# Altium footprint library ACTION_插件.PcbLib: 118 footprints (part 8 of 8)
Each footprint in its own frame and in the unit in brackets; x right, y up, seen from the top. Pads: shape width x height; smd on the part's side, far side on the other; paste and mask are expansions set on the pad; w line width, h text height; cw(c..) or ccw(c..) is an arc to the next point about the centre after c.
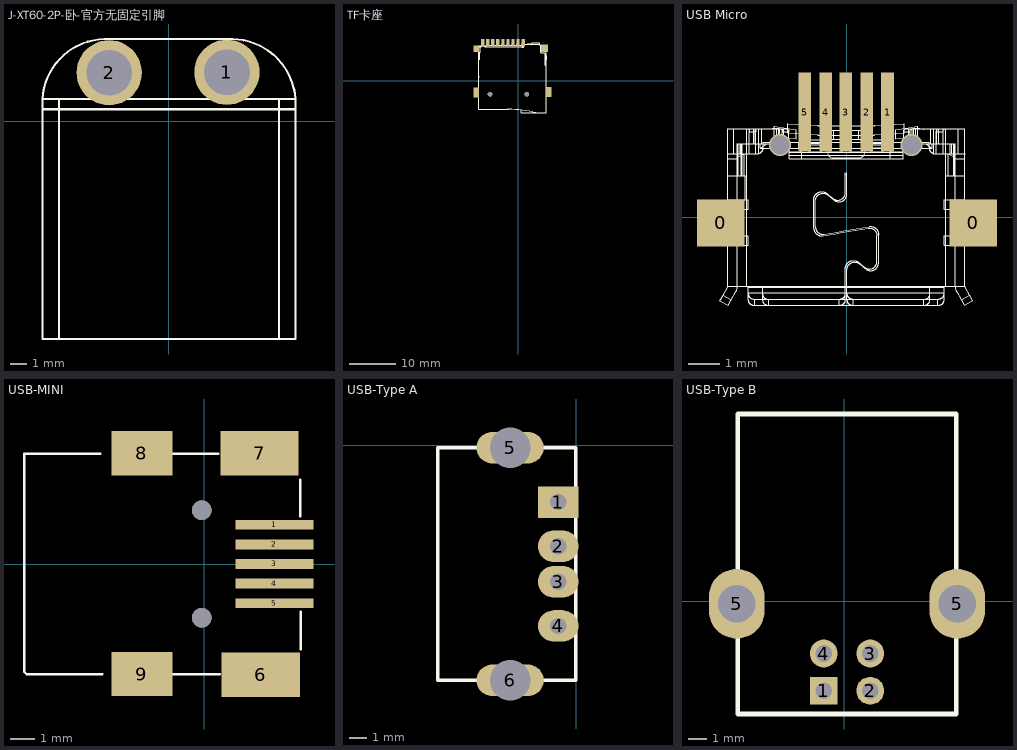
[diagram p7: the footprints below, top view; thin cyan lines are the x and y axes]

## J-XT60-2P-卧-官方无固定引脚 [mm]
pads (2):
  round 4 hole 2.8: 1(3.556,2.999) 2(-3.658,2.973)
Top Overlay:
  circle w0.127: c-3.605,2.998 r0.961
  circle w0.127: c-3.605,2.998 r1.25
  circle w0.127: c3.595,2.998 r0.961
  circle w0.127: c3.595,2.998 r1.25
  lines w0.127: -7.745,-3.607 -7.745,0.706 ; -7.745,-3.494 -7.745,-13.344 -6.745,-13.344 ; -7.095,0.706 -7.095,0.756 ; -6.745,-4.242 -6.745,0.706 ; -6.745,-3.994 -6.745,-13.344 ; -5.595,0.706 -5.595,0.756 ; 5.605,0.706 5.605,0.756 ; 6.755,-4.064 6.755,0.706 ; 6.755,-3.994 6.755,-13.344 ; 7.105,0.706 7.105,0.756 ; 7.557,1.356 7.557,1.358 ; 7.755,-3.759 7.755,0.706 ; 7.755,-3.494 7.755,-13.344 6.755,-13.344 ; -7.745,0.706 -6.745,0.706 ; -7.745,0.706 -7.745,0.756 ; -7.745,0.756 -6.745,0.756 ; -7.745,0.756 -7.745,1.356 ; -7.745,1.356 cw(c-3.852,1.136) -3.632,5.029 3.556,5.029 cw(c3.819,1.093) 7.755,1.356 ; -7.745,1.356 -6.745,1.356 ; -6.745,-13.344 6.755,-13.344 ; -6.745,0.706 6.755,0.706 ; -6.745,0.756 -6.745,1.356 ; -6.745,0.756 6.755,0.756 ; -6.745,1.356 6.755,1.356 ; 6.755,0.706 7.755,0.706 ; 6.755,0.756 6.755,1.356 ; 6.755,0.756 7.755,0.756 ; 6.755,1.356 7.755,1.356 ; 7.755,0.706 7.755,0.756 ; 7.755,0.756 7.755,1.356
3D body "XT60PW-M 3D DRAWING 214.STEP": height 8.6, standoff -1.85, extent -7.924,-13.417 7.976,4.883

## TF卡座 [mm]
height 2
pads (15):
  rect 1.2x1.5 smd: 0(-9.068,6.985)
  rect 1.2x2.2 smd: 0(-9.042,-2.515) 0(6.731,-2.464)
  round 1 hole 1: 0(-6.096,-2.921) 0(1.904,-2.921)
  rect 1.5x1.6 smd: 0(5.791,7.061)
  rect 0.7x1.6 smd: 1(1.137,8.306) 2(-0.006,8.306) 3(-1.105,8.306) 4(-2.203,8.306) 5(-3.302,8.306) 6(-4.401,8.306) 7(-5.499,8.306) 8(-6.598,8.306) 9(-7.696,8.306)
Top Overlay:
  drawing of 244 lines, arcs and shapes, not listed
3D body "User Library-MEM2055-00-190-01-A_revG.STEP": height 1.85, standoff -0.6, extent -9.169,-6.893 6.831,8.357

## USB Micro [mm]
pads (7):
  rect 1.5x1.5 smd: 0(-3.988,-0.178) 0(4.013,-0.178)
  rect 0.4x2.5 smd: 1(1.295,3.333) 2(0.635,3.333) 3(-0.025,3.333) 4(-0.66,3.333) 5(-1.321,3.333)
via 2.057,2.286 diameter 0.7 hole 0.6
via -2.108,2.286 diameter 0.7 hole 0.6
Top Overlay:
  drawing of 5548 lines, arcs and shapes, not listed
3D body "65944.stp": height 0.2, standoff -3.1, extent -4.026,-3.072 3.975,2.972

## USB-MINI [mm]
pads (9):
  rect 3.2x0.4 smd: 1(2.871,1.6) 2(2.871,0.8) 3(2.871,0) 4(2.871,-0.8) 5(2.871,-1.6)
  rect 3.2x1.8 smd: 6(2.311,-4.521) 7(2.26,4.521)
  rect 2.5x1.8 smd: 8(-2.54,4.521) 9(-2.54,-4.496)
via -0.104,-2.2 diameter 0.8 hole 0.8
via -0.104,2.2 diameter 0.8 hole 0.8
Top Overlay:
  lines w0.1: -4.839,4.5 -7.339,4.5 -7.339,-4.4 -7.239,-4.5 -4.739,-4.5
  lines w0.102: -4.839,4.5 -4.246,4.5 ; -4.739,-4.5 -4.169,-4.5 -4.165,-4.496 ; -1.6,-4.496 0.636,-4.496 ; -1.574,4.496 0.585,4.496 ; 3.912,1.956 3.912,3.429 ; 3.938,-3.48 3.938,-1.956
3D body "USB_mini_B.STEP": height 3.95, standoff -1, extent -5.976,-5.299 3.224,5.401

## USB-Type A [mil]
pads (6):
  rect 90x70 hole 36: 1(-40,-126)
  oval 90x70 hole 36: 2(-40,-224.43) 3(-40,-303.17) 4(-40,-401.59)
  oval 149.61x70 hole 90.55: 5(-146.69,-5.13) 6(-146.69,-522.46)
Top Overlay:
  lines w8: -308,-522.46 -308,-5.13 -0.63,-5.13 -0.63,-522.46 -308,-522.46
3D body "USB-A DIP.STEP": height 273.62, standoff -165.35, extent -538.68,-575 0.68,47.05

## USB-Type B [mil]
pads (6):
  rect 60x60 hole 36: 1(-44,-192)
  round 60 hole 36: 2(56,-192) 3(56,-112) 4(-44,-112)
  oval 120x150 hole 80: 5(-231,-5) 5(243,-5)
Top Overlay:
  lines w10: -229,-242 241,-242 241,-2 241,273 241,403 -229,403 -229,-2 -229,-242
3D body "USB_B.STEP": height 393.7, standoff -182.79, extent -280.27,-247 302.27,402.61